# Altium footprint library JL_PCB.PCBLIB: 1129 footprints (part 2 of 72)
Each footprint in its own frame and in the unit in brackets; x right, y up, seen from the top. Pads: shape width x height; smd on the part's side, far side on the other; paste and mask are expansions set on the pad; w line width, h text height; cw(c..) or ccw(c..) is an arc to the next point about the centre after c.
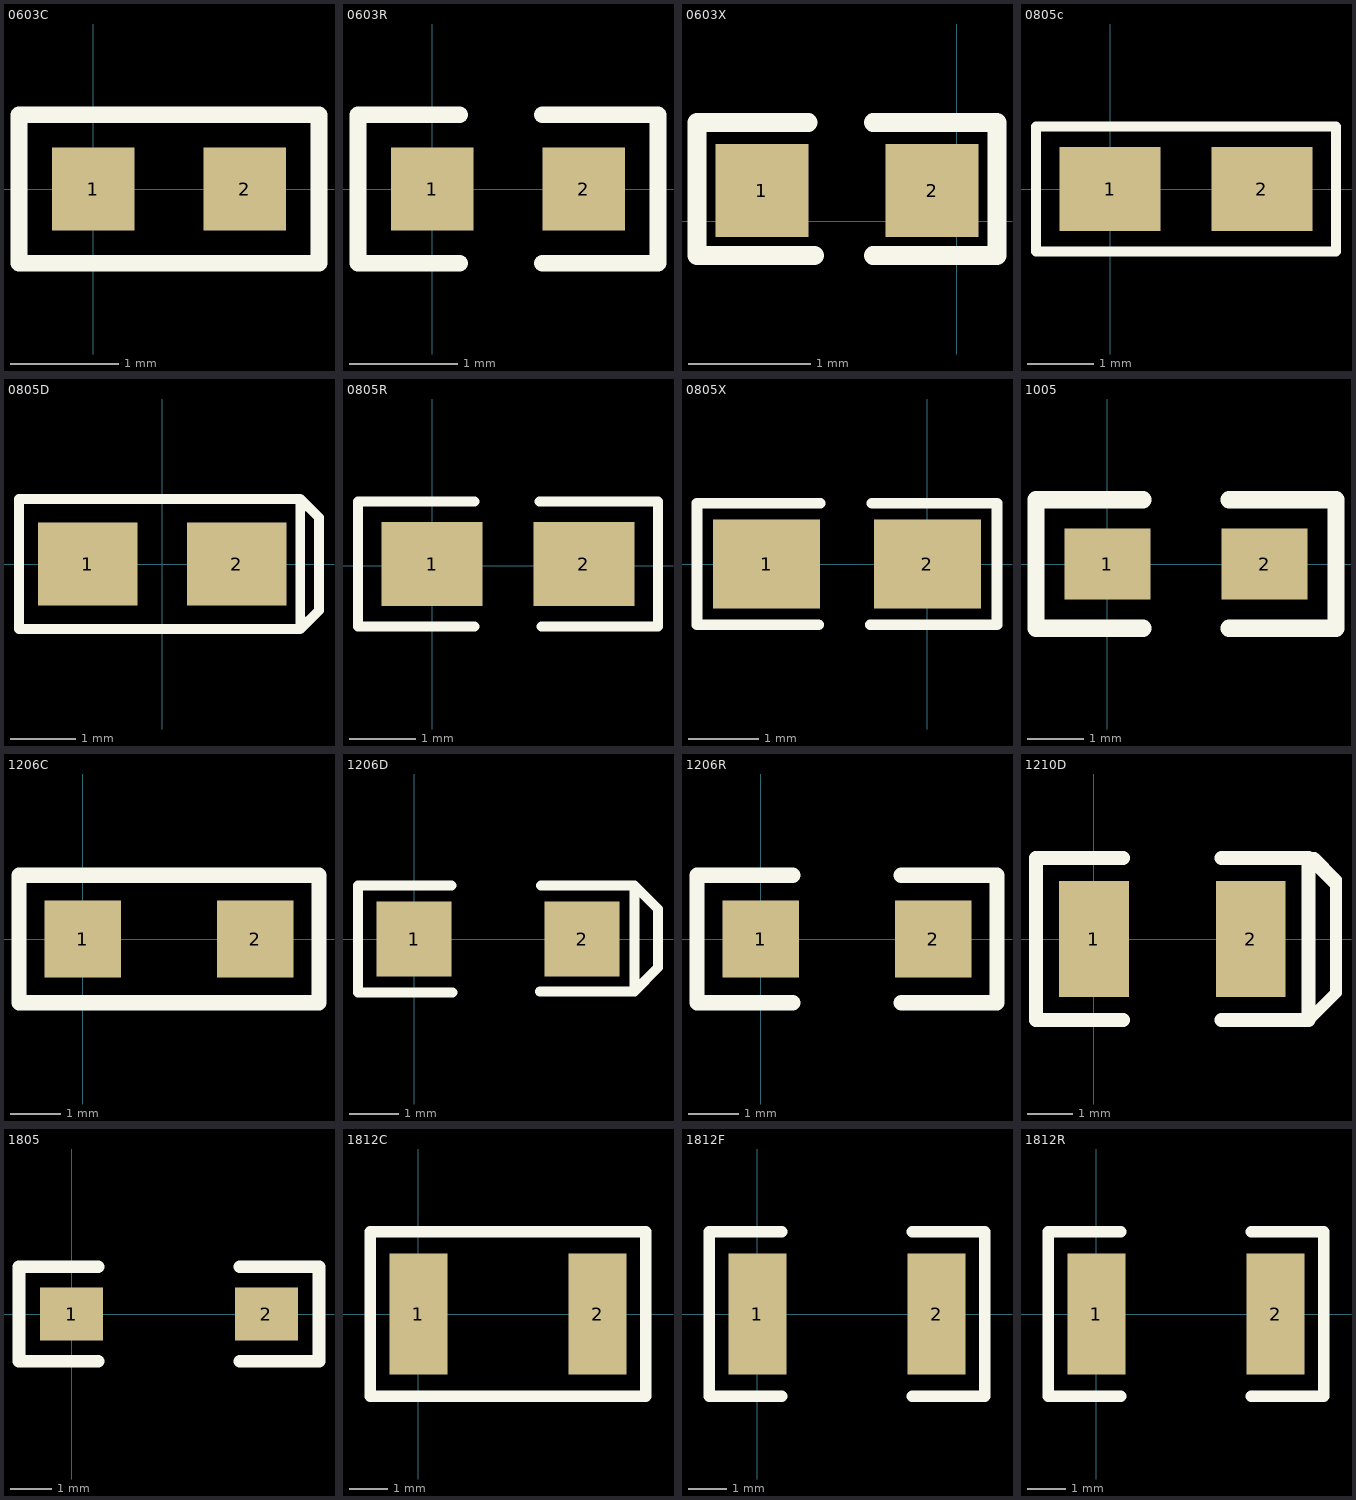
[diagram p1: the footprints below, top view; thin cyan lines are the x and y axes]

## 0603C [mil]
pads (2):
  rect 30x30 smd: 1(0,0) 2(55,0)
TopOverlay:
  lines w6: 81,27 -27,27 -27,-27 82,-27 82,27
3D body "User Library-0603 SMD Capacitor.step": height 12.49, standoff 0.6, extent -4.49,-15.75 58.51,15.75

## 0603R [mil]
pads (2):
  rect 30x30 smd: 1(0,0) 2(55,0)
TopOverlay:
  lines w6: 10,-27 -27,-27 -27,27 10,27 ; 40,-27 82,-27 82,27 40,27
3D body "User Library-RESC1608X05N.step": height 17.76, standoff 0, extent -3.51,-17.73 57.51,15.73

## 0603X [mil]
pads (2):
  rect 30x30 smd: 1(-63,10) 2(-8,10)
TopOverlay:
  lines w6: -48,32 -84,32 -84,-11 -46,-11 ; -27,-11 13,-11 13,32 -27,32
3D body "User Library-res0603-1.step": height 15.75, standoff 0, extent -66.49,-6.74 -3.5,24.75

## 0805c [mil]
pads (2):
  rect 60x50 smd: 1(0,0) 2(90,0)
TopOverlay:
  lines w6: -44,-37 -44,37 134,37 134,-37 -44,-37
3D body "User Library-0805 SMD Capacitor.step": height 31.39, standoff 0.6, extent 4.64,-24.6 83.38,24.61

## 0805D [mil]
pads (2):
  rect 60x50 smd: 1(-45,0) 2(45,0)
TopOverlay:
  lines w6: 83.33,-39.37 -86.61,-39.37 -86.61,39.37 83.33,39.37 ; 83.33,-39.37 83.33,39.37 ; 83.33,-39.37 94.69,-28.02 94.69,28.02 83.33,39.37
3D body "CircuitWorks-LED 1206.STEP": height 41.94, standoff -1.36, extent -62.99,-32.49 62.99,30.5

## 0805R [mil]
pads (2):
  rect 60x50 smd: 1(0,1) 2(90,1)
TopOverlay:
  lines w6: -44,38 -44,-36 25,-36 ; -43.31,38 25,38 ; 63.78,38 134,38 134,-36 64.96,-36
3D body "R0805.STEP": height 21.65, standoff 0, extent 4.63,-23.8 83.37,25.81

## 0805X [mil]
pads (2):
  rect 60x50 smd: 1(-90,0) 2(0,0)
TopOverlay:
  lines w6: -61,-34 -129,-34 -129,34 -60,34 ; -32,-34 39,-34 39,34 -31,34
3D body "User Library-0805 SMD Capacitor.step": height 31.39, standoff 0.6, extent -86.37,-23.6 -7.63,25.61

## 1005 [mil]
pads (2):
  rect 60x50 smd: 1(0,0) 2(110,0)
TopOverlay:
  lines w12: 25,-45 -50,-45 -50,45 25,45 ; 85,-45 160,-45 160,45 85,45

## 1206C [mil]
pads (2):
  rect 60x60 smd: 1(0,0) 2(135,0)
TopOverlay:
  lines w12: -50,-50 -50,50 110,50 185,50 185,-50 110,-50 -50,-50
3D body "User Library-1206 SMD Capacitor.step": height 40.05, standoff 0.6, extent 6.01,-33.49 132,29.5

## 1206D [mil]
pads (2):
  rect 60x60 smd: 1(0,0) 2(135,0)
TopOverlay:
  lines w8: -45,-43 -45,43 30,43 ; -44,-43 31,-43 ; 101,-42 176,-42 ; 102,43 177,43 ; 177,43 196,24 196,-23 177,-42 177,43
3D body "User Library-res1206-1.step": height 21.65, standoff 0, extent 5.02,-32.49 131,30.5

## 1206R [mil]
pads (2):
  rect 60x60 smd: 1(0,0) 2(135,0)
TopOverlay:
  lines w12: 25,-50 -50,-50 -50,50 25,50 ; 110,-50 185,-50 185,50 110,50
3D body "User Library-res1206-1.step": height 21.65, standoff 0, extent 5.02,-32.49 131,30.5

## 1210D [mil]
pads (2):
  rect 60x100 smd: 1(0,0) 2(135,0)
TopOverlay:
  lines w10: 208.66,-46.34 208.66,51.18 189.84,70 185,70 208.66,46.34 208.66,19.68 208.66,-46.34 ; 208.66,-46.34 185,-70 208.66,-46.34
  lines w12: 25,-70 -50,-70 -50,70 25,70 ; 110,-70 185,-70 185,70 110,70
3D body "CircuitWorks-LED 1206.STEP": height 41.94, standoff -1.36, extent 4.01,-31.49 129.99,31.5

## 1805 [mil]
pads (2):
  rect 60x50 smd: 1(0,0) 2(185,0)
TopOverlay:
  lines w12: 25,-45 -50,-45 -50,45 25,45 ; 160,-45 235,-45 235,45 160,45

## 1812C [mil]
pads (2):
  rect 60x125 smd: 1(0,0) 2(185,0)
TopOverlay:
  lines w12: -50,-85 -50,85 160,85 235,85 235,-85 160,-85 -50,-85
3D body "User Library-1812 SMD Capacitor.step": height 63.67, standoff 0.6, extent 4.42,-62.99 181.59,63

## 1812F [mil]
pads (2):
  rect 60x125 smd: 1(0,0) 2(185,0)
TopOverlay:
  lines w12: 25,-85 -50,-85 -50,85 25,85 ; 160,-85 235,-85 235,85 160,85
3D body "User Library-fuse1812.step": height 51.97, standoff 0, extent -0.88,-63 188.88,63.77

## 1812R [mil]
pads (2):
  rect 60x125 smd: 1(0,0) 2(185,0)
TopOverlay:
  lines w12: 25,-85 -50,-85 -50,85 25,85 ; 160,-85 235,-85 235,85 160,85
3D body "User Library-1812 SMD Resistor.step": height 63.67, standoff 0.6, extent 4.42,-62.99 181.59,63